# Altium footprint library Belle_library.PcbLib: 59 footprints (part 2 of 4)
Each footprint in its own frame and in the unit in brackets; x right, y up, seen from the top. Pads: shape width x height; smd on the part's side, far side on the other; paste and mask are expansions set on the pad; w line width, h text height; cw(c..) or ccw(c..) is an arc to the next point about the centre after c.
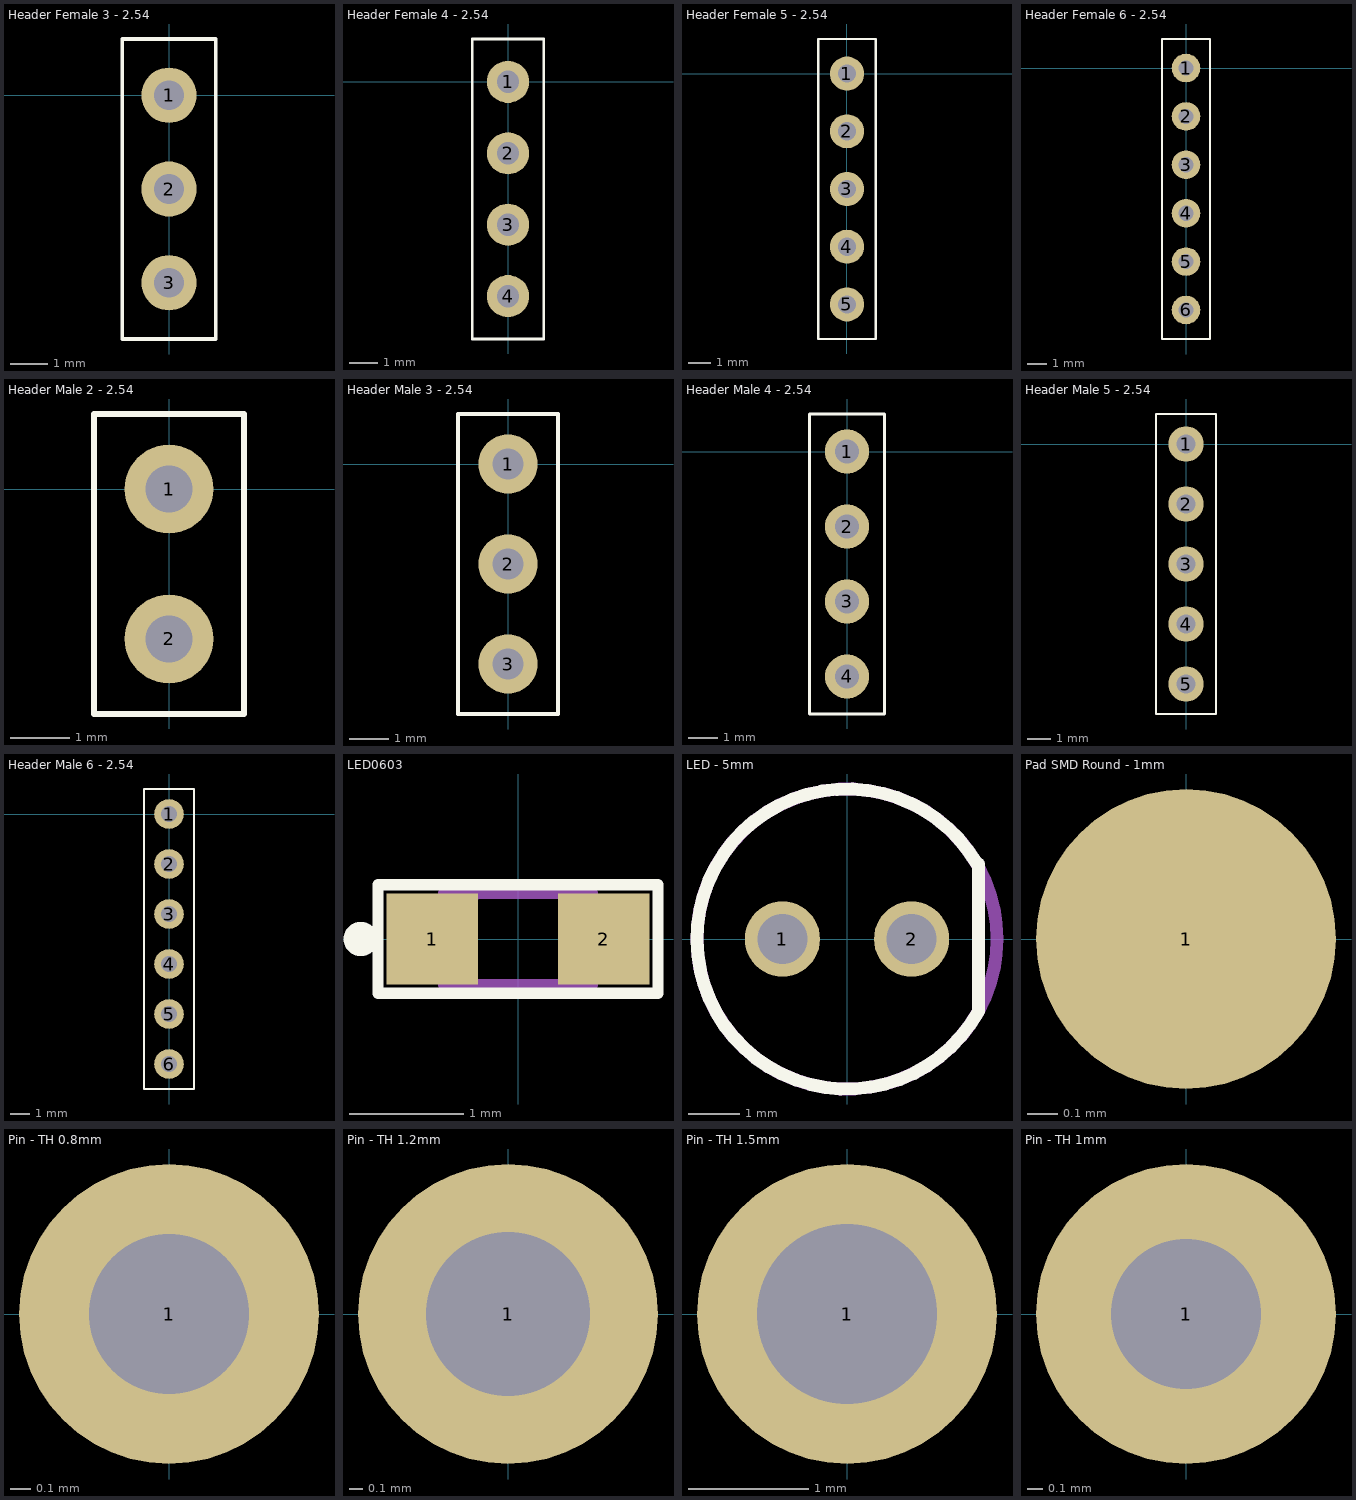
[diagram p1: the footprints below, top view; thin cyan lines are the x and y axes]

## Header Female 3 - 2.54 [mm] "header - 3 pin - pitch 2.54mm"
pads (3):
  round 1.5 hole 0.8: 1(0,0) 2(0,-2.54) 3(0,-5.08)
Top Overlay:
  lines w0.1: -1.27,-6.604 1.27,-6.604 1.27,1.524 -1.27,1.524 -1.27,-6.604
3D body "3-Pin Header - Female - 2.54mm.step": height 5, standoff -3, extent -1.25,-6.6 1.25,1.52

## Header Female 4 - 2.54 [mm] "header - 4 pin - pitch 2.54mm"
pads (4):
  round 1.5 hole 0.8: 1(0,0) 2(0,-2.54) 3(0,-5.08) 4(0,-7.62)
Top Overlay:
  lines w0.1: -1.27,-9.144 1.27,-9.144 1.27,1.524 -1.27,1.524 -1.27,-9.144
3D body "4-Pin Header - Female - 2.54mm.step": height 5, standoff -3, extent -1.25,-9.14 1.25,1.52

## Header Female 5 - 2.54 [mm] "header - 5 pin - pitch 2.54mm"
pads (5):
  round 1.5 hole 0.8: 1(0,0) 2(0,-2.54) 3(0,-5.08) 4(0,-7.62) 5(0,-10.16)
Top Overlay:
  lines w0.1: -1.27,-11.684 1.27,-11.684 1.27,1.524 -1.27,1.524 -1.27,-11.684
3D body "5-Pin Header - Female - 2.54mm.step": height 5, standoff -3, extent -1.25,-11.68 1.25,1.52

## Header Female 6 - 2.54 [mm] "header - 6 pin - pitch 2.54mm"
pads (6):
  round 1.5 hole 0.8: 1(0,0) 2(0,-2.54) 3(0,-5.08) 4(0,-7.62) 5(0,-10.16) 6(0,-12.7)
Top Overlay:
  lines w0.1: -1.27,-14.224 1.27,-14.224 1.27,1.524 -1.27,1.524 -1.27,-14.224
3D body "6-Pin Header - Female - 2.54mm.step": height 5, standoff -3, extent -1.25,-14.22 1.25,1.52

## Header Male 2 - 2.54 [mm] "header - 2 pin - pitch 2.54mm"
pads (2):
  round 1.5 hole 0.8: 1(0,0) 2(0,-2.54)
Top Overlay:
  lines w0.1: -1.27,-3.81 -1.27,1.27 1.27,1.27 1.27,-3.81 -1.27,-3.81
3D body "2x1 Male Pin Header.STEP": height 10.54, standoff -3, extent -1.27,-3.77 1.275,1.23

## Header Male 3 - 2.54 [mm] "header - 3 pin - pitch 2.54mm"
pads (3):
  round 1.5 hole 0.8: 1(0,0) 2(0,-2.54) 3(0,-5.08)
Top Overlay:
  lines w0.1: -1.27,-6.35 1.27,-6.35 1.27,1.27 -1.27,1.27 -1.27,-6.35
3D body "1x3 TH Vert 100mil.step": height 8.38, standoff -3.3, extent -1.27,-6.35 1.27,1.27

## Header Male 4 - 2.54 [mm] "header - 4 pin - pitch 2.54mm"
pads (4):
  round 1.5 hole 0.8: 1(0,0) 2(0,-2.54) 3(0,-5.08) 4(0,-7.62)
Top Overlay:
  lines w0.1: -1.27,-8.89 -1.27,1.27 1.27,1.27 1.27,-8.89 -1.27,-8.89
3D body "1x4 TH Vert 100mil.step": height 8.38, standoff -3.3, extent -1.27,-8.89 1.27,1.27

## Header Male 5 - 2.54 [mm] "header - 5 pin - pitch 2.54mm"
pads (5):
  round 1.5 hole 0.8: 1(0,0) 2(0,-2.54) 3(0,-5.08) 4(0,-7.62) 5(0,-10.16)
Top Overlay:
  lines w0.1: -1.27,-11.43 -1.27,1.27 1.27,1.27 1.27,-11.43 -1.27,-11.43
3D body "1x5 TH Vert 100mil.step": height 8.38, standoff -3.3, extent -1.27,-11.43 1.27,1.27

## Header Male 6 - 2.54 [mm] "header - 6 pin - pitch 2.54mm"
pads (6):
  round 1.5 hole 0.8: 1(0,0) 2(0,-2.54) 3(0,-5.08) 4(0,-7.62) 5(0,-10.16) 6(0,-12.7)
Top Overlay:
  lines w0.1: -1.27,-13.97 -1.27,1.27 1.27,1.27 1.27,-13.97 -1.27,-13.97
3D body "1x6 TH Vert 100mil.step": height 8.38, standoff -3.3, extent -1.27,-13.97 1.27,1.27

## LED0603 [mm] "LED0603"
pads (2):
  rect 0.8x0.8 smd mask+0: 1(-0.75,0) 2(0.75,0)
Top Overlay:
  circle w0.25: c-1.375,0 r0.025
  lines w0.1: -1.225,-0.475 1.225,-0.475 1.225,0.475 -1.225,0.475 -1.225,-0.475
Mechanical 13:
  lines w0.1: -0.65,-0.4 -0.65,0.4 0.65,0.4 0.65,-0.4 -0.65,-0.4 ; -0.65,0.115 -0.365,0.4 -0.65,0.115
3D body "LS_L29K-H1J2-1-Z.stp": height 0.67, standoff 0, extent -0.85,-0.4 0.85,0.4

## LED - 5mm [mm]
pads (2):
  round 1.48 hole 0.98: 1(-1.27,0) 2(1.27,0)
Top Overlay:
  lines w0.254: 2.553,1.478 ccw(c0,0) 2.585,-1.422 2.585,1.478 ; 2.553,1.478 2.585,1.478 ; 2.553,1.478 2.585,1.478
Mechanical 13:
  circle w0.254: c0,0 r2.95
3D body "LED 5mm white TH.stp": height 9.2, standoff -2.95, extent -2.95,-2.822 2.45,3.076

## Pad SMD Round - 1mm [mm]
pads (1):
  round 1 smd: 1(0,0)

## Pin - TH 0.8mm [mm] "Through-hole pin - 0.8mm"
pads (1):
  round 1.5 hole 0.8: 1(0,0)

## Pin - TH 1.2mm [mm] "Through-hole pin - 1.2mm"
pads (1):
  round 2.2 hole 1.2: 1(0,0)

## Pin - TH 1.5mm [mm] "Through-hole pin - 1.5mm"
pads (1):
  round 2.5 hole 1.5: 1(0,0)

## Pin - TH 1mm [mm] "Through-hole pin - 1mm"
pads (1):
  round 2 hole 1: 1(0,0)